# Altium footprint library MH_DA_THU_VIEN_16122016.PcbLib: 531 footprints (part 4 of 34)
Each footprint in its own frame and in the unit in brackets; x right, y up, seen from the top. Pads: shape width x height; smd on the part's side, far side on the other; paste and mask are expansions set on the pad; w line width, h text height; cw(c..) or ccw(c..) is an arc to the next point about the centre after c.
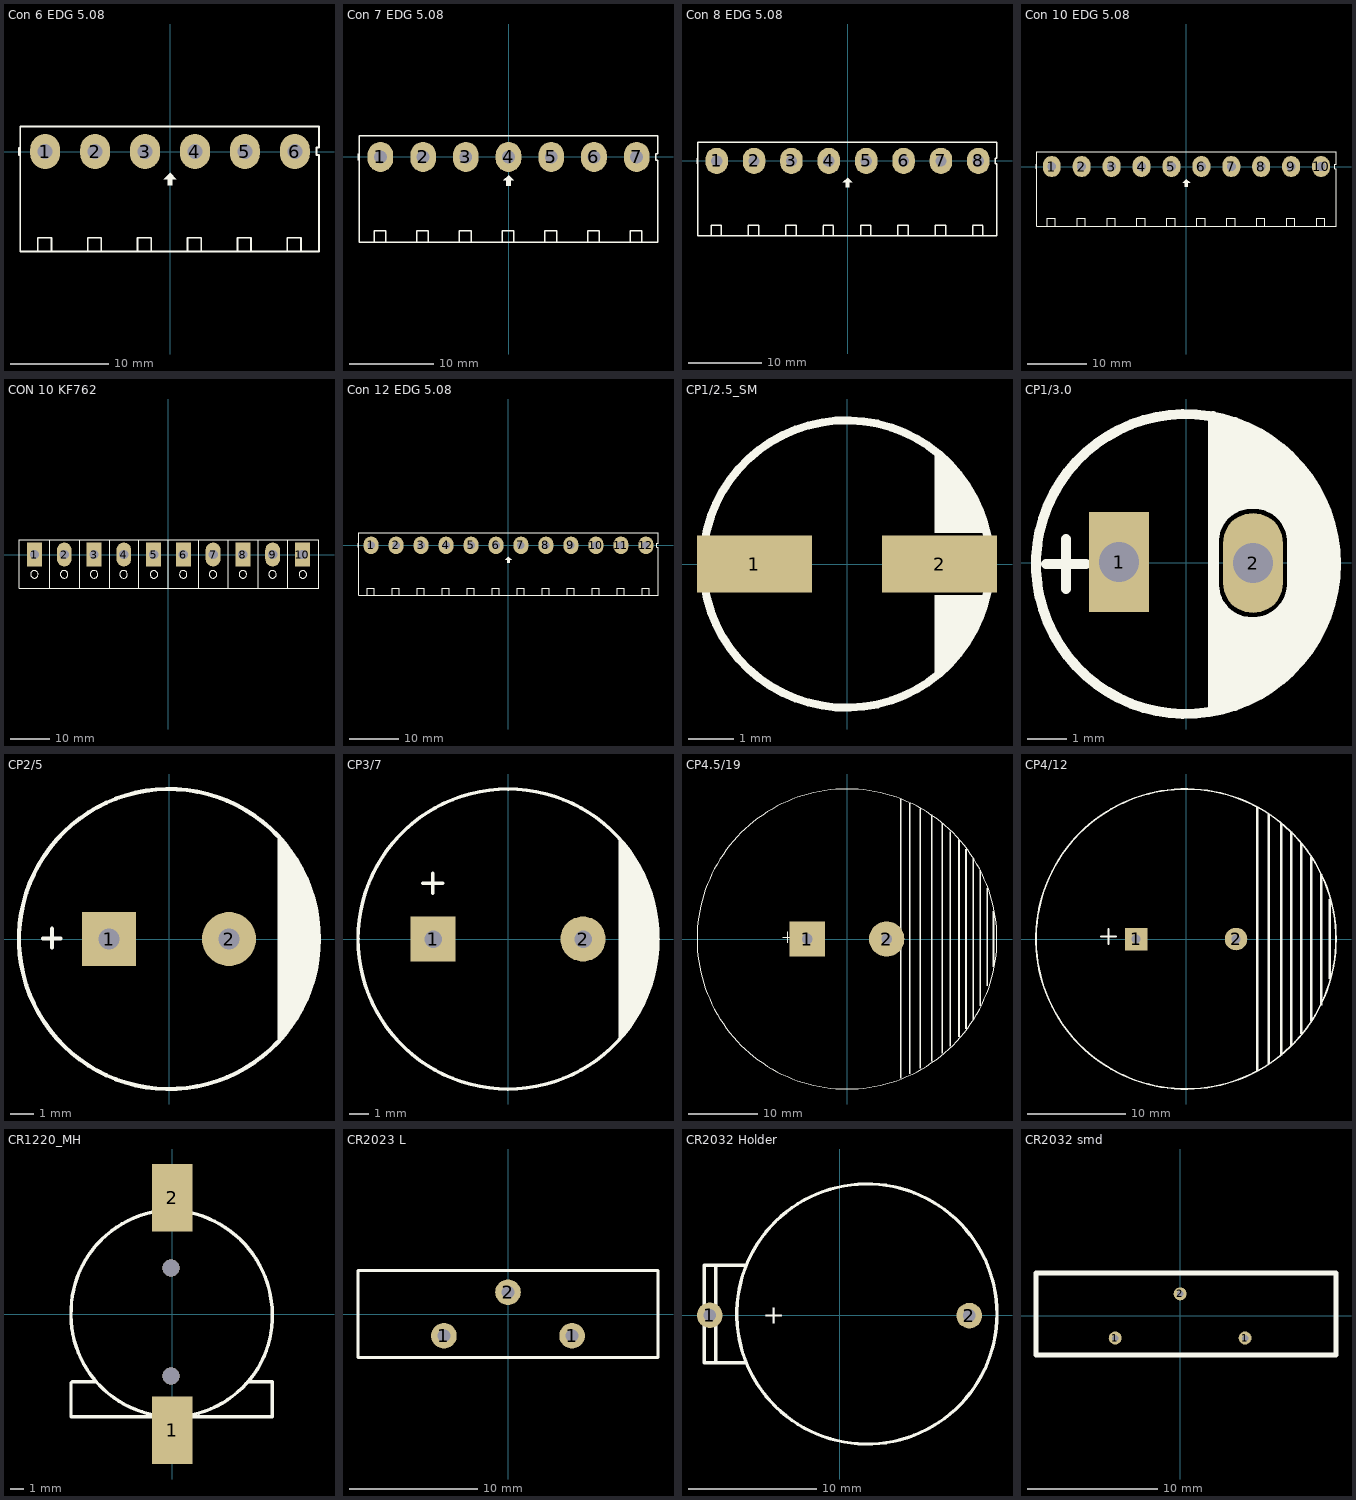
[diagram p3: the footprints below, top view; thin cyan lines are the x and y axes]

## Con 6 EDG 5.08 [mil]
pads (6):
  oval 120x140 hole 60: 1(-500.03,-0.03) 2(-300.03,-0.03) 3(-100,0) 4(100,0) 5(300,0) 6(500,0)
Top Overlay:
  region: 0,-85 -25,-110 -10,-110 -10,-135 10,-135 10,-110 25,-110
  lines w7: -605.03,-15.03 -605.03,14.97 ; -600.03,-400.03 -600.03,99.97 ; -600.03,-400 597,-400 597,-14 587,-14 587,16 597,16 597,100 -600,100 ; -530.03,-400.03 -530.03,-345.03 -475.03,-345.03 -475.03,-400.03 ; -330.03,-400.03 -330.03,-345.03 -275.03,-345.03 -275.03,-400.03 ; -130.03,-400.03 -130.03,-345.03 -75.03,-345.03 -75.03,-400.03 ; 70,-400 70,-345 125,-345 125,-400 ; 270,-400 270,-345 325,-345 325,-400 ; 470,-400 470,-345 525,-345 525,-400
3D body: height 334.11, standoff -156.88, extent 200.91,-404.22 397.76,68.22
3D body: height 334.11, standoff -156.88, extent 1.68,-404.44 198.53,68
3D body: height 334.11, standoff -156.88, extent 400.15,-404.22 597,68.22
3D body: height 334.11, standoff -156.88, extent -396.79,-404.25 -199.94,68.19
3D body: height 334.11, standoff -156.88, extent -596.03,-404.47 -399.18,67.97
3D body: height 334.11, standoff -156.88, extent -197.56,-404.25 -0.71,68.19

## Con 7 EDG 5.08 [mil]
pads (7):
  oval 120x140 hole 60: 1(-600,0) 2(-400,0) 3(-200,0) 4(0,0) 5(200,0) 6(400,0) 7(600,0)
Top Overlay:
  region: 0,-85 -25,-110 -10,-110 -10,-135 10,-135 10,-110 25,-110
  lines w7: -705,-15 -705,15 ; -630,-400 -630,-345 -575,-345 -575,-400 ; -430,-400 -430,-345 -375,-345 -375,-400 ; -230,-400 -230,-345 -175,-345 -175,-400 ; -30,-400 -30,-345 25,-345 25,-400 ; 170,-400 170,-345 225,-345 225,-400 ; 370,-400 370,-345 425,-345 425,-400 ; 570,-395 570,-345.8 ; 570,-345 625,-345 ; 625,-395 625,-345.8 ; -700,-400 -700,100 700,100 700,15 690,15 690,-15 700,-15 700,-400 -700,-400
3D body: height 334.11, standoff -156.88, extent 500.15,-402.22 697,70.22
3D body: height 334.11, standoff -156.88, extent 101.43,-402.22 298.28,70.22
3D body: height 334.11, standoff -156.88, extent -97.92,-402.22 98.93,70.22
3D body: height 334.11, standoff -156.88, extent 300.79,-402.22 497.64,70.22
3D body: height 334.11, standoff -156.88, extent -496.64,-402.22 -299.79,70.22
3D body: height 334.11, standoff -156.88, extent -696,-402.22 -499.15,70.22
3D body: height 334.11, standoff -156.88, extent -297.28,-402.22 -100.43,70.22

## Con 8 EDG 5.08 [mil]
pads (8):
  oval 120x140 hole 60: 1(-700,0) 2(-500,0) 3(-300,0) 4(-100,0) 5(100,0) 6(300,0) 7(500,0) 8(700,0)
Top Overlay:
  region: 0,-90 -25,-115 -10,-115 -10,-140 10,-140 10,-115 25,-115
  lines w7: -805.2,-15.2 -805.2,14.8 ; -730.2,-400.2 -730.2,-345.2 -675.2,-345.2 -675.2,-400.2 ; -530.2,-400.2 -530.2,-345.2 -475.2,-345.2 -475.2,-400.2 ; -330.2,-400.2 -330.2,-345.2 -275.2,-345.2 -275.2,-400.2 ; -130.2,-395.2 -130.2,-346 ; -130.2,-345.2 -75.2,-345.2 ; -75.2,-395.2 -75.2,-346 ; 69.8,-400.2 69.8,-345.2 124.8,-345.2 124.8,-400.2 ; 269.8,-400.2 269.8,-345.2 324.8,-345.2 324.8,-400.2 ; 469.8,-400.2 469.8,-345.2 524.8,-345.2 524.8,-400.2 ; 669.8,-395.2 669.8,-346 ; 669.8,-345.2 724.8,-345.2 ; 724.8,-395.2 724.8,-346 ; -800.2,-400.2 -0.2,-400.2 799.8,-400.2 799.8,-15.2 789.8,-15.2 789.8,14.8 799.8,14.8 799.8,99.8 -0.2,99.8 -800.2,99.8 -800.2,-400.2
3D body: height 334.11, standoff -156.88, extent -397.3,-402.42 -200.44,70.02
3D body: height 334.11, standoff -156.88, extent -796.19,-402.42 -599.34,70.02
3D body: height 334.11, standoff -156.88, extent -596.75,-402.42 -399.89,70.02
3D body: height 334.11, standoff -156.88, extent -197.85,-402.42 -1,70.02
3D body: height 334.11, standoff -156.88, extent 400.5,-402.42 597.35,70.02
3D body: height 334.11, standoff -156.88, extent 1.6,-402.42 198.45,70.02
3D body: height 334.11, standoff -156.88, extent 201.05,-402.42 397.9,70.02
3D body: height 334.11, standoff -156.88, extent 599.95,-402.42 796.8,70.02

## Con 10 EDG 5.08 [mil]
pads (10):
  oval 120x140 hole 60: 1(-900,0) 2(-700,0) 3(-500,0) 4(-300,0) 7(300,0) 8(500,0) 9(700,0) 10(900,0)
  oval 120x140 hole 62.99: 5(-100,0) 6(100,0)
Top Overlay:
  region: 0,-85 -25,-110 -10,-110 -10,-135 10,-135 10,-110 25,-110
  lines w7: -1005.2,-15.2 -1005.2,14.8 ; -930.2,-400.2 -930.2,-345.2 -875.2,-345.2 -875.2,-400.2 ; -730.2,-400.2 -730.2,-345.2 -675.2,-345.2 -675.2,-400.2 ; -530.2,-400.2 -530.2,-345.2 -475.2,-345.2 -475.2,-400.2 ; -330.2,-395.2 -330.2,-346 ; -330.2,-345.2 -275.2,-345.2 ; -275.2,-395.2 -275.2,-346 ; -130,-400 -130,-345 -75,-345 -75,-400 ; 70,-400 70,-345 125,-345 125,-400 ; 269.8,-400.2 269.8,-345.2 324.8,-345.2 324.8,-400.2 ; 469.8,-400.2 469.8,-345.2 524.8,-345.2 524.8,-400.2 ; 669.8,-400.2 669.8,-345.2 724.8,-345.2 724.8,-400.2 ; 869.8,-395.2 869.8,-346 ; 869.8,-345.2 924.8,-345.2 ; 924.8,-395.2 924.8,-346 ; -1000.2,-400.2 999.8,-400.2 999.8,-15.2 989.8,-15.2 989.8,14.8 999.8,14.8 999.8,99.8 -1000.2,99.8 -1000.2,-400.2
3D body: height 334.11, standoff -156.88, extent 1.66,-402.42 198.52,70.02
3D body: height 334.11, standoff -156.88, extent -197.91,-402.42 -1.06,70.02
3D body: height 334.11, standoff -156.88, extent 600.38,-402.42 797.23,70.02
3D body: height 334.11, standoff -156.88, extent 201.24,-402.42 398.09,70.02
3D body: height 334.11, standoff -156.88, extent 400.81,-402.42 597.66,70.02
3D body: height 334.11, standoff -156.88, extent 799.95,-402.42 996.8,70.02
3D body: height 334.11, standoff -156.88, extent -597.05,-402.42 -400.2,70.02
3D body: height 334.11, standoff -156.88, extent -996.19,-402.42 -799.34,70.02
3D body: height 334.11, standoff -156.88, extent -796.62,-402.42 -599.77,70.02
3D body: height 334.11, standoff -156.88, extent -397.48,-402.42 -200.63,70.02

## CON 10 KF762 [mil]
pads (10):
  rect 150x240 hole 95: 1(-1350,0) 3(-750,0) 5(-150,0) 6(150,0) 8(750,0) 10(1350,0)
  oval 150x240 hole 95: 2(-1050,0) 4(-450,0) 7(450,0) 9(1050,0)
Top Overlay:
  circle w8: c-146,-200.7 r38.08
  circle w8: c-750,-199.7 r38.08
  circle w8: c-452,-199.7 r38.08
  circle w8: c-1051.2,-200 r38.08
  circle w8: c-1351.2,-200 r38.08
  circle w8: c1354,-200.7 r38.08
  circle w8: c750,-199.7 r38.08
  circle w8: c1048,-199.7 r38.08
  circle w8: c448.8,-200 r38.08
  circle w8: c148.8,-200 r38.08
  lines w7.87: -1506,149.3 0,149.3 0,-339.7 ; -1505.74,-339.67 -1505.74,-339.27 -1505.74,149.3 ; -1505,-339.7 -5,-339.7 1517,-339.7 ; -1195,-339.7 -1195,149.3 ; -896,-340.7 -896,148.3 ; -594,-340.7 -594,148.3 ; -297,-339.7 -297,149.3 ; -6,149.3 1517,149.3 1517,-339.7 ; 305,-339.7 305,149.3 ; 604,-340.7 604,148.3 ; 906,-340.7 906,148.3 ; 1203,-339.7 1203,149.3 ; 1517,125.3 1517,-339.7

## Con 12 EDG 5.08 [mil]
pads (12):
  oval 120x140 hole 60: 1(-1100.03,-0.03) 2(-900.03,-0.03) 3(-700,0) 4(-500,0) 5(-300,0) 6(-100,0) 7(100,0) 8(300,0) 9(500.03,0.03) 10(700.03,0.03) 11(900.03,0.03) 12(1100.03,0.03)
Top Overlay:
  region: 0,-90 -25,-115 -10,-115 -10,-140 10,-140 10,-115 25,-115
  lines w7: -1205.03,-15.03 -1205.03,14.97 ; -1200.03,-400.03 -1200.03,99.97 ; -1200.03,-400 1197.03,-400 ; -1200,100 1197.03,100 ; -1130.03,-400.03 -1130.03,-345.03 -1075.03,-345.03 -1075.03,-400.03 ; -930.03,-400.03 -930.03,-345.03 -875.03,-345.03 -875.03,-400.03 ; -730.03,-400.03 -730.03,-345.03 -675.03,-345.03 -675.03,-400.03 ; -530,-400 -530,-345 -475,-345 -475,-400 ; -330,-400 -330,-345 -275,-345 -275,-400 ; -130,-400 -130,-345 -75,-345 -75,-400 ; 70,-400 70,-345 125,-345 125,-400 ; 270,-400 270,-345 325,-345 325,-400 ; 470,-400 470,-345 525,-345 525,-400 ; 670.03,-399.97 670.03,-344.97 725.03,-344.97 725.03,-399.97 ; 870.03,-399.97 870.03,-344.97 925.03,-344.97 925.03,-399.97 ; 1070.03,-399.97 1070.03,-344.97 1125.03,-344.97 1125.03,-399.97 ; 1197.03,-399.97 1197.03,-13.97 1187.03,-13.97 1187.03,16.03 1197.03,16.03 1197.03,100.03
3D body: height 334.11, standoff -156.88, extent 401.59,-404.19 598.44,68.25
3D body: height 334.11, standoff -156.88, extent 1.58,-404.19 198.43,68.25
3D body: height 334.11, standoff -156.88, extent 201.58,-404.19 398.43,68.25
3D body: height 334.11, standoff -156.88, extent 1001.61,-404.19 1198.46,68.25
3D body: height 334.11, standoff -156.88, extent 601.59,-404.19 798.45,68.25
3D body: height 334.11, standoff -156.88, extent 801.6,-404.19 998.45,68.25
3D body: height 334.11, standoff -156.88, extent -798.45,-404.19 -601.59,68.25
3D body: height 334.11, standoff -156.88, extent -1198.46,-404.19 -1001.61,68.25
3D body: height 334.11, standoff -156.88, extent -998.45,-404.19 -801.6,68.25
3D body: height 334.11, standoff -156.88, extent -198.43,-404.19 -1.58,68.25
3D body: height 334.11, standoff -156.88, extent -598.44,-404.19 -401.59,68.25
3D body: height 334.11, standoff -156.88, extent -398.43,-404.19 -201.58,68.25

## CP1/2.5_SM [mil] "Tu hoa SMD 33 >100 uF,50V, 220uF/16V,25V"
height 100
pads (2):
  rect 100x50 smd: 1(-80.5,0) 2(80.5,0)
Top Overlay:
  circle w7: c-0.5,0 r125
  region: 76.5,98 76.5,27 121.5,27 122.5,9 119.5,-26 119.25,-27 76.5,-27 76.5,-98 90.5,-86 105.5,-67 119.5,-38 124.5,-19 124.5,18 119.5,37 111.5,58 95.5,82
  lines w7: -115.5,0 -95.5,0 ; -105.5,-10 -105.5,-5 -105.5,5 -105.5,10

## CP1/3.0 [mil]
pads (2):
  rect 60x100 hole 40: 1(-67,0.5)
  oval 60x100 hole 40: 2(67,-0.5)
Top Overlay:
  circle w10: c0,-1.5 r150
  region: 27,147.5 27,38.5 55,59.5 77,59.5 99,43.5 108,-1.5 100,-41.5 75,-60.5 40,-51.5 26,-34.5 27,-148.5 86,-126.5 142,-58.5 150,17.5 119,94.5 73,130.5
  lines w10: -140,-1.5 -100,-1.5 ; -120,-26.5 -120,23.5 ; 27,-145.5 27,146.5 ; 28,-25.5 28,23.5 cw(c65.5,21) 65.01,58.58 ; 28,-23.5 ccw(c65.5,-22) 67,-59.5 ccw(c67.5,-21) 106,-21.5 ; 65,58.5 cw(c68,20.5) 106,23.5 ; 106,-28.5 106,26.5
3D body: height 452.87, standoff -747.43, extent -156,-160.98 158.96,153.98

## CP2/5 [mil] "Tu hoa 1000uF/25V,50V"
height 600
pads (2):
  rect 90x90 hole 35: 1(-100,0)
  round 90 hole 35: 2(100,0)
Top Overlay:
  circle w7: c0,0 r250
  region: 181,174 181,-175 200,-149 201,-151 218,-124 234,-90 249,-29 250,0 248,34 241,70 221,116
  lines w7: -210,1 -181,1 ; -195,-14 -195,17
3D body: height 984.37, standoff -747.43, extent -241.06,-247.12 251.06,245

## CP3/7 [mil] "Tu hoa 4700uF/25V"
height 600
pads (2):
  rect 90x90 hole 35: 1(-150,0)
  round 90 hole 35: 2(150,0)
Top Overlay:
  circle w7: c0,0 r300
  region: 275,112 283,96 292,79 297,39 300,-9 299,-34 292,-69 279,-115 247,-171 232,-191 221,-203 221,200 234.5,182.5 245,168 258,153
  lines w7: -171,112 -131,112 ; -151,92 -151,132

## CP4.5/19 [mil] "Tu hoa 10,000uF/63V"
height 600
pads (2):
  rect 200x200 hole 60: 1(-225,0)
  round 200 hole 60: 2(225,0)
Top Overlay:
  circle w7: c0,0 r850
  rectangle: 300,-790 310,795
  rectangle: 350,-765 360,770
  rectangle: 410,-735 420,740
  rectangle: 475,-695 485,705
  rectangle: 825,-160 835,160
  rectangle: 790,-265 800,290
  rectangle: 535,-650 545,655
  rectangle: 580,-610 590,610
  rectangle: 630,-555 640,560
  rectangle: 670,-510 680,510
  rectangle: 710,-455 720,455
  rectangle: 750,-380 760,390
  lines w7: -365,10 -305,10 ; -335,-20 -335,40

## CP4/12 [mil] "Tu hoa 220uF/450V"
height 600
pads (2):
  rect 90x90 hole 35: 1(-200,0)
  round 90 hole 35: 2(200,0)
Top Overlay:
  circle w7: c0,0 r600
  rectangle: 570,-160 580,160
  rectangle: 535,-265 545,260
  rectangle: 280,-530 290,530
  rectangle: 325,-500 335,500
  rectangle: 375,-465 385,465
  rectangle: 415,-425 425,430
  rectangle: 455,-380 465,385
  rectangle: 495,-330 505,330
  lines w7: -340,10 -280,10 ; -310,-20 -310,40

## CR1220_MH [mm]
pads (2):
  rect 3x5 smd: 1(0,-8.6) 2(0,8.6)
via -0.1,-4.6 diameter 1.27 hole 1.27
via -0.1,3.4 diameter 1.27 hole 1.27
Top Overlay:
  lines w0.254: -7.5,-5.1 -7.5,-7.6 7.4,-7.6 ; -7.4,-5 -5.7,-5 ; -0.5,7.7 cw(c-0.4,-0.1) 7.4,0 cw(c-0.05,-0.15) 0.1,-7.6 cw(c0.05,-0.05) -7.5,-0.1 cw(c0.1,0.1) -0.1,7.7 ; 5.6,-5 7.4,-5 7.4,-7.6 ; 7.4,-7.5 7.4,-5.1 ; 7.4,-7.4 7.4,-7.6
3D body: height 4.27, standoff -0.48, extent -7.649,-9.2 7.1,9.6

## CR2023 L [mm]
pads (3):
  round 2 hole 1: 1(-5,-1.7) 1(5,-1.7) 2(0,1.7)
Top Overlay:
  lines w0.254: -11.7,-3.4 11.7,-3.4 11.7,3.4 -0.2,3.4 -11.7,3.4 -11.7,-3.4
3D body: height 18.26, standoff -2.99, extent -11.55,-3.2 11.539,3.2

## CR2032 Holder [mm]
pads (2):
  round 2 hole 1: 1(-10.135,0.013) 2(10.135,-0.013)
Top Overlay:
  circle w0.254: c2.134,0.114 r10.161
  lines w0.254: -9.677,-3.696 -9.677,3.924 ; -7.391,-3.696 -10.566,-3.696 -10.566,3.924 -7.391,3.924
  text "+" at -5.994,-0.648 h1.52
3D body: height 8.52, standoff -3.98, extent -11.239,-10.962 13.261,11.038

## CR2032 smd [mm]
pads (3):
  round 1 hole 0.5: 1(-5,-1.7) 1(5,-1.7) 2(0,1.7)
Top Overlay:
  lines w0.4: -11.1,-3 12,-3 12,3.3 -11.1,3.3 -11.1,-3
3D body: height 19.51, standoff -1.74, extent -11.15,-3.1 11.948,3.3